# Altium footprint library CAD_Footprints.PcbLib: 39 footprints (part 1 of 3)
Each footprint in its own frame and in the unit in brackets; x right, y up, seen from the top. Pads: shape width x height; smd on the part's side, far side on the other; paste and mask are expansions set on the pad; w line width, h text height; cw(c..) or ccw(c..) is an arc to the next point about the centre after c.
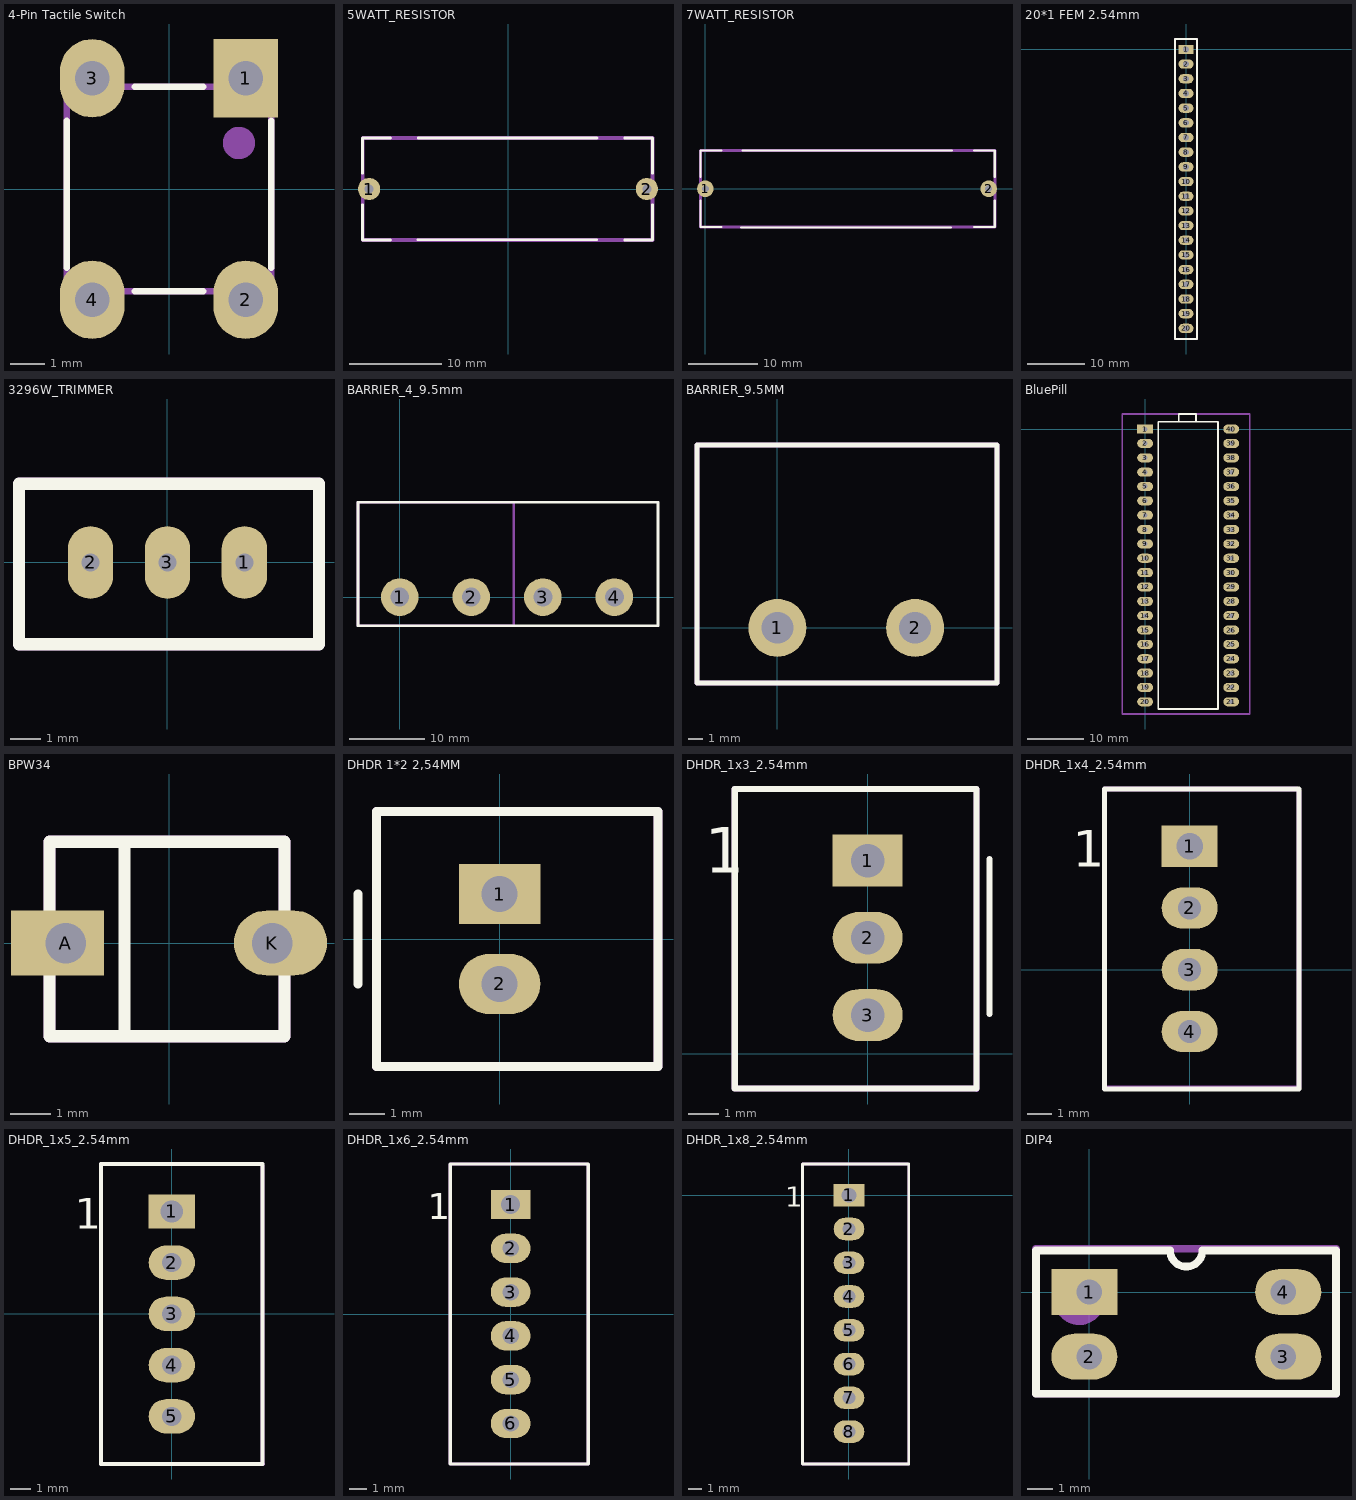
[diagram p0: the footprints below, top view; thin cyan lines are the x and y axes]

## 4-Pin Tactile Switch [mm]
pads (4):
  rect 1.9x2.3 hole 1: 1(2.25,3.25)
  oval 1.9x2.3 hole 1: 2(2.25,-3.25) 3(-2.25,3.25) 4(-2.25,-3.25)
Top Overlay:
  lines w0.2: -3,-2.3 -3,2 ; -1,-3 1,-3 ; -1,3 1,3 ; 3,-2.3 3,2
Mechanical 2:
  circle w0.5: c2.05,1.35 r0.224
  lines w0.2: -3,-3 3,-3 3,3 -3,3 -3,-3
  text ".Designator" at -2.525,-0.925 h1.6
3D body "User Library-FSM4JLH(1825910-5).step": height 5.01, standoff -3.5, extent -2.995,-3.898 2.995,3.9

## 5WATT_RESISTOR [mm]
pads (2):
  round 2.4 hole 1: 1(-15,0) 2(15,0)
Top Overlay:
  lines w0.3: -15.7,-1.7 -15.7,-5.5 -12.7,-5.5 ; -15.7,1.7 -15.7,5.5 -12.7,5.5 ; -9.71,-5.492 9.59,-5.492 ; -9.7,5.5 9.6,5.5 ; 12.6,-5.5 15.6,-5.5 15.6,-1.7 ; 12.6,5.5 15.6,5.5 15.6,1.7
Mechanical 2:
  lines w0.4: -15.7,-5.5 -15.7,5.5 15.6,5.5 15.6,-5.5 -15.7,-5.5
  text ".Designator" at -10.6,-1.4 h3
3D body "sqp-500_pitch-30mm_max-size.step": height 10, standoff -3, extent -15.425,-5.25 15.425,5.25

## 7WATT_RESISTOR [mm]
pads (2):
  round 2.4 hole 1: 1(0,0) 2(40.65,0)
Top Overlay:
  lines w0.3: -0.7,-1.7 -0.7,-5.5 2.3,-5.5 ; -0.7,1.7 -0.7,5.5 2.3,5.5 ; 5.125,-5.575 35.225,-5.575 ; 5.3,5.5 35.4,5.5 ; 38.525,-5.5 41.525,-5.5 41.525,-1.7 ; 38.525,5.5 41.525,5.5 41.525,1.7
Mechanical 2:
  lines w0.4: -0.7,-5.5 -0.7,5.5 41.575,5.5 41.575,-5.5 -0.7,-5.5
  text ".Designator" at 4.4,-1.4 h3
3D body "RES_SQPH_7W_1600mil_0R_J(5%).STEP": height 10, standoff -3.6, extent -0.45,-5.025 41.09,4.975

## 20*1 FEM 2.54mm [mm]
pads (20):
  rect 2.6x1.6 hole 1: 1(0,0)
  oval 2.6x1.6 hole 1: 2(0,-2.54) 3(0,-5.08) 4(0,-7.62) 5(0,-10.16) 6(0,-12.7) 7(0,-15.24) 8(0,-17.78) 9(0,-20.32) 10(0,-22.86) 11(0,-25.4) 12(0,-27.94) 13(0,-30.48) 14(0,-33.02) 15(0,-35.56) 16(0,-38.1) 17(0,-40.64) 18(0,-43.18) 19(0,-45.72) 20(0,-48.26)
Top Overlay:
  lines w0.3: -1.9,-50.1 -1.9,1.8 1.9,1.8 1.9,-50.1 -1.9,-50.1
Mechanical 2:
  lines w0.3: -1.9,-50.1 -1.9,1.8 1.9,1.8 1.9,-50.1 -1.9,-50.1
  text ".Designator" at 0.638,-19.346 h1.52
3D body "m20-7820842_asm.stp": height 8.51, standoff -2.99, extent -1.25,-19.25 1.25,1.47
3D body "m20-7820842_asm.stp": height 8.51, standoff -2.99, extent -1.25,-37.03 1.25,-16.31
3D body "m20-7820842_asm.stp": height 8.51, standoff -2.99, extent -1.25,-49.73 1.25,-29.01

## 3296W_TRIMMER [mm]
pads (3):
  oval 1.5x2.4 hole 0.6: 1(2.54,0) 2(-2.54,0) 3(0,0)
Top Overlay:
  lines w0.4: -4.9,-2.7 5,-2.7 5,2.6 -4.9,2.6 -4.9,-2.7
Mechanical 2:
  lines w0.4: -4.9,-2.7 5,-2.7 5,2.6 -4.9,2.6 -4.9,-2.7
  text ".Designator" at -2.45,-0.85 h1.5
3D body "User Library-3296_Bourns.step": height 11.55, standoff -7.62, extent -4.765,-2.415 4.765,2.415

## BARRIER_4_9.5mm [mm]
pads (4):
  round 5 hole 2.5: 1(0,0) 2(9.5,0) 3(19,0) 4(28.5,0)
Top Overlay:
  lines w0.35: -5.55,-3.8 34.29,-3.8 34.29,12.6 -5.55,12.6 -5.55,-3.8
Mechanical 2:
  lines w0.35: -5.55,-3.8 -5.55,12.6 15.15,12.6 15.15,-3.8 -5.55,-3.8
  text ".Designator" at -2.45,5.7 h4
3D body "hb9500_asm.stp": height 20.61, standoff -4.43, extent -5.5,-3.725 15.1,12.475
3D body "hb9500_asm.stp": height 20.61, standoff -4.43, extent 4,-3.725 24.6,12.475
3D body "hb9500_asm.stp": height 20.61, standoff -4.43, extent 13.5,-3.725 34.1,12.475

## BARRIER_9.5MM [mm]
pads (2):
  round 4 hole 2.2: 1(0,0) 2(9.5,0)
Top Overlay:
  lines w0.35: -5.55,-3.8 -5.55,12.6 15.15,12.6 15.15,-3.8 -5.55,-3.8
Mechanical 2:
  lines w0.35: -5.55,-3.8 -5.55,12.6 15.15,12.6 15.15,-3.8 -5.55,-3.8
  text ".Designator" at -2.45,5.7 h4
3D body "hb9500_asm.stp": height 20.61, standoff -4.43, extent -5.5,-3.725 15.1,12.475

## BluePill [mm] "STM32_BluePill"
pads (40):
  rect 2.8x1.6 hole 0.8: 1(0,0)
  oval 2.8x1.6 hole 0.8: 2(0,-2.54) 3(0,-5.08) 4(0,-7.62) 5(0,-10.16) 6(0,-12.7) 7(0,-15.24) 8(0,-17.78) 9(0,-20.32) 10(0,-22.86) 11(0,-25.4) 12(0,-27.94) 13(0,-30.48) 14(0,-33.02) 15(0,-35.56) 16(0,-38.1) 17(0,-40.64) 18(0,-43.18) 19(0,-45.72) 20(0,-48.26) 21(15.24,-48.26) 22(15.24,-45.72) 23(15.24,-43.18) 24(15.24,-40.64) 25(15.24,-38.1) 26(15.24,-35.56) 27(15.24,-33.02) 28(15.24,-30.48) 29(15.24,-27.94) 30(15.24,-25.4) 31(15.24,-22.86) 32(15.24,-20.32) 33(15.24,-17.78) 34(15.24,-15.24) 35(15.24,-12.7) 36(15.24,-10.16) 37(15.24,-7.62) 38(15.24,-5.08) 39(15.24,-2.54) 40(15.24,0)
Top Overlay:
  lines w0.3: 6.985,1.27 2.335,1.27 2.335,-49.53 12.905,-49.53 12.905,1.27 8.255,1.27 ; 5.969,1.27 9.017,1.27 9.017,2.667 5.969,2.667 5.969,1.27
Mechanical 2:
  lines w0.3: -4.064,-50.419 18.542,-50.419 18.542,2.667 -4.064,2.667 -4.064,-50.419
  text ".Designator" at 2.713,-20.584 h2.5
3D body "YAAJ_BluePill.step": height 19.8, standoff 7.3, extent -4.058,-50.376 18.542,2.624
3D body "m20-7820842_asm.stp": height 8.51, standoff -2.99, extent 13.99,-34.363 16.49,-13.643
3D body "m20-7820842_asm.stp": height 8.51, standoff -2.99, extent 13.99,-49.603 16.49,-28.883
3D body "m20-7820842_asm.stp": height 8.51, standoff -2.99, extent 13.99,-19.123 16.49,1.597
3D body "m20-7820842_asm.stp": height 8.51, standoff -2.99, extent -1.25,-34.49 1.25,-13.77
3D body "m20-7820842_asm.stp": height 8.51, standoff -2.99, extent -1.25,-49.73 1.25,-29.01
3D body "m20-7820842_asm.stp": height 8.51, standoff -2.99, extent -1.25,-19.25 1.25,1.47

## BPW34 [mm]
pads (2):
  rect 2.3x1.6 hole 1 copper offset -0.2,0: A(-2.55,0)
  oval 2.3x1.6 hole 1 copper offset 0.2,0: K(2.55,0)
Top Overlay:
  lines w0.3: -1.2,2.5 -1.1,2.5 -1.1,-2.3 ; -2.95,-2.3 -2.95,2.5 2.85,2.5 2.85,-2.3 -2.95,-2.3
Mechanical 2:
  lines w0.3: -2.95,-2.3 -2.95,2.5 2.85,2.5 2.85,-2.3 -2.95,-2.3
  text ".Designator" at -1.748,-0.533 h1
3D body "bpw34.STEP": height 3.09, standoff -2.11, extent -2.736,-2.097 2.664,2.303

## DHDR 1*2 2,54MM [mm]
pads (2):
  rect 2.3x1.7 hole 1.016: 1(0,1.27)
  oval 2.3x1.7 hole 1.016: 2(0,-1.27)
Top Overlay:
  lines w0.254: -4,-1.275 -4,1.275 ; -3.475,-3.607 4.475,-3.607 4.475,3.607 -3.475,3.607 -3.475,-3.607
Mechanical 2:
  lines w0.254: -3.475,-3.607 -3.475,3.607 4.475,3.607 4.475,-3.607 -3.475,-3.607
  text ".Designator" at -2.7,-0.85 h2.5
3D body "c-2-644861-2-n-3d.stp": height 10.43, standoff -3.54, extent -3.475,-3.607 4.475,3.607

## DHDR_1x3_2.54mm [mm]
pads (3):
  rect 2.3x1.7 hole 1.1: 1(0,6.35)
  oval 2.3x1.7 hole 1.1: 2(0,3.81) 3(0,1.27)
Top Overlay:
  lines w0.2: 4,1.3 4,6.4 ; -4.369,-1.143 -4.369,8.7 3.581,8.7 3.581,-1.143 -4.369,-1.143
  text "1" at -5.359,5.944 h1.5
Mechanical 2:
  lines w0.2: 3.567,-1.143 -4.369,-1.143 -4.369,8.7 3.581,8.7 3.581,-1.158
  text ".Designator" at 2.4,-1.3 h4.5
3D body "c-2-644861-3-n-3d.stp": height 9.66, standoff -4.31, extent -4.432,-1.041 3.518,8.712

## DHDR_1x4_2.54mm [mm]
pads (4):
  rect 2.3x1.7 hole 1.1: 1(0,5.08)
  oval 2.3x1.7 hole 0.95: 2(0,2.54) 3(0,0) 4(0,-2.54)
Top Overlay:
  lines w0.2: 4.495,7.425 4.495,-4.902 -3.5,-4.902 -3.5,7.43 4.5,7.43
  text "1" at -4.8,4.23 h1.5
Mechanical 2:
  lines w0.2: 4.4,7.43 -3.5,7.43 -3.5,-4.851 4.5,-4.851 4.5,7.33
  text ".Designator" at 2.438,-2.565 h4.5
3D body "c-2-644861-4-n-3d.stp": height 10.43, standoff -3.54, extent -3.467,-4.953 4.483,7.341

## DHDR_1x5_2.54mm [mm]
pads (5):
  rect 2.3x1.7 hole 1.1: 1(0,5.08)
  oval 2.3x1.7 hole 0.95: 2(0,2.54) 3(0,0) 4(0,-2.54) 5(0,-5.08)
Top Overlay:
  lines w0.2: -3.505,-7.442 4.495,-7.442 4.495,7.425 ; -3.5,-7.437 -3.5,7.43 4.5,7.43
  text "1" at -4.8,4.23 h1.5
Mechanical 2:
  lines w0.2: -3.5,-7.442 -3.5,7.43 4.4,7.43 ; -3.48,-7.442 4.52,-7.442 ; 4.5,-7.322 4.5,7.33
  text ".Designator" at 2.4,-2.57 h4.5
3D body "c-2-644861-5-n-3d.stp": height 10.43, standoff -3.54, extent -3.492,-7.417 4.458,7.417

## DHDR_1x6_2.54mm [mm]
pads (6):
  rect 2.3x1.7 hole 1.1: 1(0,6.35)
  oval 2.3x1.7 hole 0.95: 2(0,3.81) 3(0,1.27) 4(0,-1.27) 5(0,-3.81) 6(0,-6.35)
Top Overlay:
  lines w0.2: -3.5,-8.7 4.5,-8.7 4.5,8.7 -3.5,8.7 -3.5,-8.7
  text "1" at -4.8,5.5 h1.5
Mechanical 2:
  lines w0.2: -3.5,-8.7 -3.5,8.7 4.4,8.7 4.5,8.6 4.5,-8.7 -3.5,-8.7
  text ".Designator" at 2.667,-3.302 h4.5
3D body "c-2-644861-6-n-3d.stp": height 10.43, standoff -3.54, extent -3.505,-8.687 4.445,8.687

## DHDR_1x8_2.54mm [mm]
pads (8):
  rect 2.3x1.7 hole 1.1: 1(0,0)
  oval 2.3x1.7 hole 0.95: 2(0,-2.54) 3(0,-5.08) 4(0,-7.62) 5(0,-10.16) 6(0,-12.7) 7(0,-15.24) 8(0,-17.78)
Top Overlay:
  lines w0.2: 4.495,2.345 4.495,-20.218 -3.5,-20.218 -3.5,2.35 4.5,2.35
  text "1" at -4.8,-0.85 h1.5
Mechanical 2:
  lines w0.2: 4.4,2.35 -3.5,2.35 -3.5,-20.218 4.5,-20.218 4.5,2.25
  text ".Designator" at 2.4,-7.65 h4.5
3D body "c-2-644861-8-n-3d.stp": height 10.43, standoff -3.54, extent -3.467,-20.168 4.483,2.286

## DIP4 [mm]
pads (4):
  rect 2.6x1.8 hole 1 copper offset -0.2,0: 1(0,0)
  oval 2.6x1.8 hole 1 copper offset -0.2,0: 2(0,-2.54)
  oval 2.6x1.8 hole 1 copper offset 0.2,0: 3(7.62,-2.54) 4(7.62,0)
Top Overlay:
  lines w0.3: -2.1,-4 -2.1,1.635 3.175,1.635 ccw(c3.81,1.635) 4.445,1.635 9.7,1.635 9.7,-4 -2.1,-4
Mechanical 2:
  circle w1: c-0.4,-0.3 r0.5
  lines w0.3: -2.1,-4 -2.1,1.7 9.7,1.7 9.7,-4 -2.1,-4
  text ".Designator" at 3.9,-5.5 h2.5
3D body "DIP4.STEP": height 4.7, standoff -2.6, extent -0.135,-3.56 7.735,1.16